# Altium footprint library SMT.PcbLib: 379 footprints (part 2 of 24)
Each footprint in its own frame and in the unit in brackets; x right, y up, seen from the top. Pads: shape width x height; smd on the part's side, far side on the other; paste and mask are expansions set on the pad; w line width, h text height; cw(c..) or ccw(c..) is an arc to the next point about the centre after c.
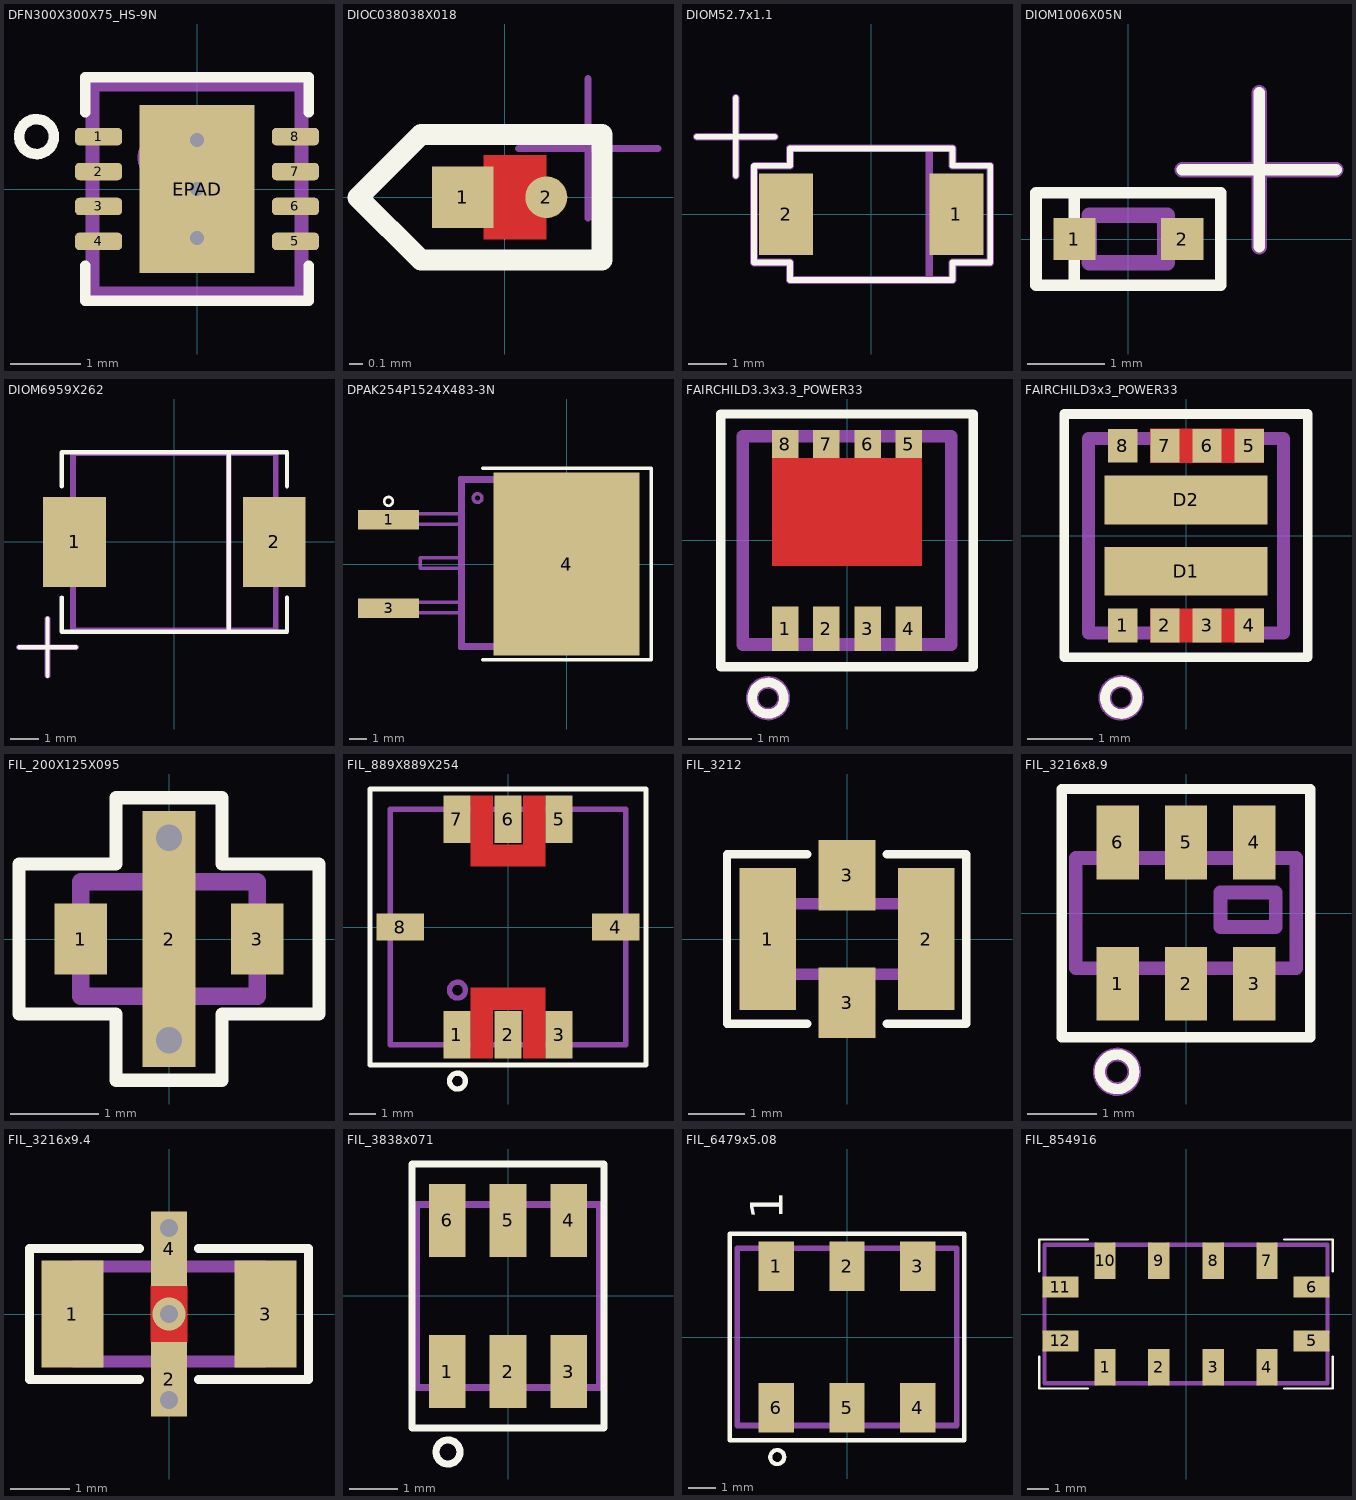
[diagram p1: the footprints below, top view; thin cyan lines are the x and y axes]

## DFN300X300X75_HS-9N [mm] "DFN, 8-Leads, Body 3,00x3,00mm, Pitch 0,5mm, Thermal Pad 1,65x2,40mm, IPC Medium Density"
height 0.75
pads (9):
  rrect50% 0.675x0.25 smd mask+0.05: 1(-1.41,0.75) 2(-1.41,0.25) 3(-1.41,-0.25) 4(-1.41,-0.75) 5(1.41,-0.75) 6(1.41,-0.25) 7(1.41,0.25) 8(1.41,0.75)
  rect 1.65x2.4 hole 0.2 mask+0.05: EPAD(0,0)
via 0,0.7 diameter 0.5 hole 0.2
via 0,-0.7 diameter 0.5 hole 0.2
Top Overlay:
  circle w0.15: c-2.3,0.75 r0.25
  lines w0.15: -1.6,-1.1 -1.6,-1.6 1.6,-1.6 1.6,-1.1 ; -1.6,1.1 -1.6,1.6 1.6,1.6 1.6,1.1
Top Paste:
  rectangle: -0.35,-0.65 0.35,0.65
Mechanical 1:
  circle w0.2: c-0.5,0.45 r0.25
  lines w0.2: -1.5,-1.5 1.5,-1.5 1.5,1.5 -1.5,1.5 -1.5,-1.5
3D body "User Library-My-DFN-8-3x3-0_5.STEP": height 0.81, standoff 0.01, extent -1.56,-1.55 1.56,1.55

## DIOC038038X018 [mm] "Chip diode 0.38mmx0.38mmx0.18mm"
height 0.18
pads (2):
  rect 0.44x0.44 smd paste-25.4 mask+0.05: 1(-0.3,0)
  round 0.3 smd paste-25.4 mask+0.05: 2(0.3,0)
Top Layer:
  pour cut-out: -0.15,-0.3 0.3,-0.3 0.3,0.3 -0.15,0.3
Top Overlay:
  lines w0.15: -1.05,0 -0.6,0.45 0.7,0.45 0.7,-0.45 -0.6,-0.45 -1.05,0
Mechanical 1:
  circle w0.05: c-0.3,0 r0.04
  lines w0.03: -0.3,0 ccw(c-0.15,0.35) 0,0 cw(c0.15,-0.35) 0.3,0
  lines w0.05: 0.1,0.35 1.1,0.35 ; 0.6,-0.15 0.6,0.85 ; -0.49,-0.19 -0.49,0.19 -0.11,0.19 -0.11,-0.19 -0.49,-0.19
Mechanical 20:
  text "Установка с помощью термокомпресионной сварки проволокой Кр Зл  999,9-0,03М ГОСТ 7222-75" at -2.143,1.487 h1.2
3D body "ma4l-134.STEP": height 0.26, standoff 0.01, extent -0.489,-0.191 0.316,0.189

## DIOM52.7x1.1 [mm]
height 1.1
pads (2):
  rect 1.4x2.1 smd paste-0.1: 1(2.2,0) 2(-2.2,0)
Top Overlay:
  lines w0.15: -4.5,2 -2.5,2 ; -3.5,1 -3.5,3 ; -2.1,-1.3 -2.1,-1.7 2.1,-1.7 2.1,-1.25 3.075,-1.25 3.075,1.25 2.1,1.25 2.1,1.7 -2.1,1.7 -2.1,1.25 -3.025,1.25 -3.025,-1.25 -2.1,-1.25
Mechanical 1:
  lines w0.2: -4.5,2 -2.5,2 ; -3.5,1 -3.5,3 ; -2.1,1.675 -2.1,1.25 ; 1.5,-1.7 1.5,1.7 ; -2.1,1.25 -3,1.25 -3.025,1.225 -3.025,-1.25 -2.1,-1.25 -2.1,-1.7 2.1,-1.7 2.1,-1.25 3.075,-1.25 3.075,1.25 2.1,1.25 2.1,1.7 -2.1,1.7 -2.1,1.25
3D body "User Library-SOD128.STEP": height 1.11, standoff 0, extent -2.5,-1.35 2.5,1.35

## DIOM1006X05N [mm] "Molded Diode, 2-Leads, Body 0,98x0,59mm, IPC Medium Density"
height 0.5
pads (2):
  rect 0.55x0.55 smd: 1(-0.7,0) 2(0.7,0)
Top Overlay:
  lines w0.15: -0.7,-0.6 -0.7,0.6 ; 0.7,0.9 2.7,0.9 ; 1.7,-0.1 1.7,1.9 ; -1.2,-0.6 1.2,-0.6 1.2,0.6 -1.2,0.6 -1.2,-0.6
Mechanical 1:
  rectangle: 0.373,-0.31 0.51,0.31
  lines w0.2: 0.7,0.9 2.7,0.9 ; 1.7,-0.1 1.7,1.9 ; -0.51,-0.31 0.51,-0.31 0.51,0.31 -0.51,0.31 -0.51,-0.31
3D body "DIOM1006X05N.step": height 0.5, standoff 0, extent -0.73,-0.31 0.73,0.31

## DIOM6959X262 [mm] "Molded Diode, 2-Leads, Body 6,85x5,90mm, IPC Medium Density"
height 2.62
pads (2):
  rect 2.2x3.15 smd: 1(-3.5,0) 2(3.5,0)
Top Overlay:
  lines w0.15: -5.45,-3.7 -3.45,-3.7 ; -4.45,-4.7 -4.45,-2.7 ; -3.95,-1.95 -3.95,-3.15 3.95,-3.15 3.95,-1.95 ; -3.95,1.95 -3.95,3.15 3.95,3.15 3.95,1.95 ; 1.905,-3.15 1.905,3.15
Mechanical 1:
  lines w0.2: -5.45,-3.7 -3.45,-3.7 ; -4.45,-4.7 -4.45,-2.7 ; 1.905,-3.11 1.905,3.11 ; -3.555,-3.11 -3.555,3.11 3.555,3.11 3.555,-3.11 -3.555,-3.11
3D body "DIOM7959X262N.STEP": height 2.62, standoff 0, extent -3.95,-2.95 3.95,2.95

## DPAK254P1524X483-3N [mm] "D2-PAK, 3-Pads, Body 7,93x8,50mm (max), IPC Medium Density"
height 4.83
pads (3):
  rect 3.504x1.1 smd: 1(-10.213,2.54) 3(-10.213,-2.54)
  rect 8.4x10.5 hole 0.3: 4(0,0)
Top Overlay:
  circle w0.15: c-10.213,3.598 r0.25
  lines w0.2: -4.801,-5.5 4.851,-5.5 4.851,5.5 -4.801,5.5
Top Paste:
  rectangle: -3.25,0.5 -0.5,3.25
  region: 3.25,3.25 0.5,3.25 0.5,0.5 3.25,0.5
  region: 3.25,-0.5 0.5,-0.5 0.5,-3.25 3.25,-3.25
  rectangle: -3.25,-3.25 -0.5,-0.5
Mechanical 1:
  circle w0.2: c-5.105,3.785 r0.25
  lines w0.2: -6.139,-2.787 -8.899,-2.787 ; -6.139,-2.187 -8.899,-2.187 ; -6.139,-0.247 -8.399,-0.247 -8.399,0.353 -6.139,0.353 ; -6.139,2.293 -8.899,2.293 ; -6.139,2.893 -8.899,2.893 ; -8.899,-2.787 -8.899,-2.187 ; -8.899,-2.787 -10.899,-2.787 -10.899,-2.187 -8.899,-2.187 ; -8.899,2.293 -8.899,2.893 ; -8.899,2.293 -10.899,2.293 -10.899,2.893 -8.899,2.893 ; -6.139,-4.847 2.761,-4.847 ; -6.139,-4.847 -6.139,4.953 ; -6.139,-4.847 -5.939,-4.647 ; -6.139,4.953 2.761,4.953 ; -6.139,4.953 -5.939,4.753 ; -5.939,-4.647 2.561,-4.647 ; -5.939,-4.647 -5.939,4.753 ; -5.939,4.753 2.561,4.753 ; 2.561,-4.647 2.561,4.753 ; 2.561,-4.647 2.761,-4.847 ; 2.561,4.753 2.761,4.953 ; 2.761,-4.847 2.861,-4.847 ; 2.761,4.953 2.861,4.953 ; 2.861,-4.847 3.601,-4.847 4.001,-4.447 4.001,4.553 3.601,4.953 2.861,4.953 ; 2.861,-4.847 2.861,4.953
3D body "D2Pack.stp": height 4.5, standoff 0, extent -11.521,-4.925 3.379,4.875

## FAIRCHILD3.3x3.3_POWER33 [mm] "Power33, 8-Leads, Body 3.3x3.3mm"
height 0.8
pads (8):
  rect 0.42x0.7 smd paste-0.01 mask+0.05: 1(-0.975,-1.4) 2(-0.325,-1.4) 3(0.325,-1.4) 4(0.975,-1.4)
  rect 0.42x0.45 smd paste-0.01 mask+0.05: 5(0.975,1.525) 6(0.325,1.525) 7(-0.325,1.525) 8(-0.975,1.525)
Top Layer:
  region: -1.185,-0.4 -1.185,1.3 1.185,1.3 1.185,-0.4
Top Overlay:
  circle w0.15: c-1.25,-2.5 r0.25
  lines w0.15: -2,-2 -2,2 2,2 2,-2 -2,-2
Top Paste:
  region: -1.17,0.5 -1.17,1.2 -0.1,1.2 -0.1,0.5
  region: -1.17,-0.37 -1.17,0.3 -0.1,0.3 -0.1,-0.37
  region: 0.1,0.5 0.1,1.2 1.17,1.2 1.17,0.5
  region: 0.1,-0.37 0.1,0.3 1.17,0.3 1.17,-0.37
Top Solder:
  region: -1.235,-0.45 -1.235,1.348 1.235,1.348 1.235,-0.45
Mechanical 1:
  circle w0.2: c-1.25,-2.5 r0.25
  lines w0.2: -1.65,-1.65 -1.65,1.65 1.65,1.65 1.65,-1.65 -1.65,-1.65
3D body "FCM8327L.STEP": height 0.75, standoff 0, extent -1.65,-1.65 1.65,1.65

## FAIRCHILD3x3_POWER33 [mm] "Power33, 10-Leads, Body 3x3mm"
height 0.8
pads (10):
  rect 0.45x0.52 smd mask+0.04: 1(-0.975,-1.385) 2(-0.325,-1.385) 3(0.325,-1.385) 4(0.975,-1.385) 5(0.975,1.385) 6(0.325,1.385) 7(-0.325,1.385) 8(-0.975,1.385)
  rect 2.52x0.75 smd paste-0.05 mask+0.04: D1(0,-0.55) D2(0,0.55)
Top Layer:
  region: -0.55,1.125 -0.55,1.645 1.2,1.645 1.2,1.125
  region: -0.55,-1.645 -0.55,-1.125 1.2,-1.125 1.2,-1.645
Top Overlay:
  circle w0.15: c-1,-2.5 r0.25
  lines w0.15: -1.875,-1.875 -1.875,1.875 1.875,1.875 1.875,-1.875 -1.875,-1.875
Top Solder:
  region: -0.59,-1.685 -0.59,-1.085 1.24,-1.085 1.24,-1.685
  region: -0.59,1.085 -0.59,1.685 1.24,1.685 1.24,1.085
Mechanical 1:
  circle w0.2: c-1,-2.5 r0.25
  lines w0.2: -1.5,-1.5 1.5,-1.5 1.5,1.5 -1.5,1.5 -1.5,-1.5
3D body "3D MODEL.stp": height 0.8, standoff 0, extent -1.5,-1.5 1.5,1.5

## FIL_200X125X095 [mm] "F0805, 3-Leads, Body 2,0x1,25mm"
height 0.95
pads (3):
  rect 0.6x0.8 smd paste+0: 1(-1,0) 3(1,0)
  rect 0.6x2.9 smd paste-10 mask-10: 2(0,0)
via 0,1.15 diameter 0.6 hole 0.3
via 0,-1.15 diameter 0.6 hole 0.3
Top Overlay:
  lines w0.15: -1.7,-0.85 -0.6,-0.85 -0.6,-1.6 0.6,-1.6 0.6,-0.85 1.7,-0.85 1.7,0.85 0.6,0.85 0.6,1.6 -0.6,1.6 -0.6,0.85 -1.7,0.85 -1.7,-0.85
Top Paste:
  rectangle: -0.3,0.3 0.3,0.95
  rectangle: -0.3,-0.95 0.3,-0.3
Top Solder:
  rectangle: -0.3,0.3 0.3,0.95
  rectangle: -0.3,-0.95 0.3,-0.3
Mechanical 1:
  lines w0.2: -1,-0.65 -1,0.65 1,0.65 1,-0.65 -1,-0.65
3D body "User Library-EMIFIL_0805.STEP": height 0.85, standoff 0, extent -1,-0.625 1,0.625

## FIL_889X889X254 [mm] "GP731, 8-Leads, Body 8,89x8,89mm"
height 2.54
pads (8):
  rect 1.02x1.78 smd: 1(-1.93,-4.064) 2(0,-4.064) 3(1.93,-4.064) 5(1.93,4.064) 6(0,4.064) 7(-1.93,4.064)
  rect 1.78x1.02 smd: 4(4.064,0) 8(-4.064,0)
Top Layer:
  pour cut-out: -1.397,-4.953 -1.397,-2.286 1.397,-2.286 1.397,-4.953 0.572,-4.953 0.572,-3.111 -0.572,-3.111 -0.572,-4.953
  pour cut-out: -1.397,4.953 -1.397,2.286 1.397,2.286 1.397,4.953 0.572,4.953 0.572,3.111 -0.572,3.111 -0.572,4.953
Top Overlay:
  circle w0.2: c-1.905,-5.81 r0.3
  lines w0.2: -5.207,-5.207 -5.207,5.207 5.207,5.207 5.207,-5.207 -5.207,-5.207
Mechanical 1:
  circle w0.2: c-1.905,-2.381 r0.3
  lines w0.2: -4.445,-4.445 4.445,-4.445 4.445,4.445 -4.445,4.445 -4.445,-4.445
3D body "Корпус GP731 (Mini-Circuits).stp": height 2.54, standoff 0, extent -4.445,-4.445 4.445,4.445

## FIL_3212 [mm] "SMD; Body: 3,2x1,25x3,2; Фильтр помехоподавляющий"
height 3.2
pads (4):
  rect 1x2.5 smd mask+0.05: 1(-1.4,0) 2(1.4,0)
  rect 1x1.25 smd paste+0 mask+0.05: 3(0,-1.125) 3(0,1.125)
Top Overlay:
  lines w0.15: -0.7,-1.5 -2.12,-1.5 -2.12,1.5 -0.7,1.5 ; 0.7,-1.5 2.11,-1.5 2.11,1.5 0.7,1.5
Mechanical 1:
  lines w0.2: -1.6,-0.625 1.6,-0.625 1.6,0.625 -1.6,0.625 -1.6,-0.625
3D body "Б36 _ ФИЛЬТР.stp": height 3.2, standoff 0, extent -1.6,-0.626 1.6,0.626

## FIL_3216x8.9 [mm] "FILTER 4-Leads, Body 3,20x1,60mm"
height 0.89
pads (6):
  rect 0.61x1.07 smd: 1(-0.99,-1.025) 2(0,-1.025) 3(0.99,-1.025) 4(0.99,1.025) 5(0,1.025) 6(-0.99,1.025)
Top Overlay:
  circle w0.15: c-1,-2.3 r0.25
  lines w0.15: -1.8,-1.8 -1.8,1.8 1.8,1.8 1.8,-1.8 -1.8,-1.8
Mechanical 1:
  circle w0.2: c-1,-2.3 r0.25
  lines w0.2: -1.6,-0.8 -1.6,0.8 1.6,0.8 1.6,-0.8 -1.6,-0.8 ; 0.5,-0.2 0.5,0.3 1.3,0.3 1.3,-0.2 0.5,-0.2
3D body "QCN-45+.stp": height 0.93, standoff 0.02, extent -1.6,-0.81 1.6,0.81

## FIL_3216x9.4 [mm] "FILTER 4-Leads, Body 3,20x1,60mm"
height 0.94
pads (4):
  rect 1.04x1.8 smd: 1(-1.625,0) 3(1.625,0)
  rect 0.61x1.25 smd paste-5 mask-5: 2(0,-1.1) 4(0,1.1)
via 0,1.45 diameter 0.55 hole 0.3
via 0,-1.45 diameter 0.55 hole 0.3
via 0,0.001 diameter 0.55 hole 0.3
Top Layer:
  region: -0.305,0.476 -0.305,-0.475 0.305,-0.475 0.305,0.476
Top Overlay:
  lines w0.15: -2.35,1.1 -2.35,-1.105 -0.5,-1.105 ; -2.35,1.105 -0.5,1.105 ; 0.5,-1.105 2.35,-1.105 2.35,1.105 0.5,1.105
Top Paste:
  rectangle: -0.275,0.475 0.275,1.15
  rectangle: -0.275,-1.149 0.275,-0.474
Top Solder:
  rectangle: -0.305,0.425 0.305,1.2
  rectangle: -0.305,-1.2 0.305,-0.425
Mechanical 1:
  lines w0.2: -1.6,-0.8 -1.6,0.8 1.6,0.8 1.6,-0.8 -1.6,-0.8
3D body "1206-3.STEP": height 1.27, standoff 0.02, extent -1.6,-0.821 1.6,0.829

## FIL_3838x071 [mil] "FR933 3.81x3.81x0.71"
height 27.95
pads (6):
  rect 30x60 smd: 1(-50,-62) 2(0,-62) 3(50,-62) 4(50,62) 5(0,62) 6(-50,62)
Top Overlay:
  circle w5.91: c-49.21,-127.95 r9.84
  lines w5.91: -78.74,-108.27 -78.74,108.27 78.74,108.27 78.74,-108.27 -78.74,-108.27
Mechanical 1:
  circle w7.87: c-49.21,-49.21 r9.84
  lines w5.91: -74.99,-74.99 -74.99,75 75,75 75,-74.99 -74.99,-74.99
3D body "HFTC-9R5.stp": height 28.39, standoff 0.44, extent -74.99,-74.99 75,75

## FIL_6479x5.08 [mm] "FILTER 6-Leads, Body 6,35x7,87mm"
height 5.08
pads (6):
  rect 1.27x1.78 smd: 1(-2.54,2.54) 2(0,2.54) 3(2.54,2.54) 4(2.54,-2.54) 5(0,-2.54) 6(-2.54,-2.54)
Top Overlay:
  circle w0.15: c-2.5,-4.3 r0.25
  lines w0.15: -4.2,-3.7 4.2,-3.7 4.2,3.7 -4.2,3.7 -4.2,-3.7
  text "1" at -1.9,4.2 h2
Mechanical 1:
  circle w0.2: c-2.5,-2.5 r0.25
  lines w0.2: -3.93,-3.17 3.94,-3.17 3.94,3.18 -3.93,3.18 -3.93,-3.17
3D body "RMS-25MH+.stp": height 5.11, standoff 0.02, extent -3.935,-3.185 3.935,3.185

## FIL_854916 [mm] "Ceramic 13.30 x 6.50 x 1.75 mm"
height 1.96
pads (12):
  rect 1x1.7 smd paste-0.05 mask+0.05: 1(-3.805,-2.5) 2(-1.275,-2.5) 3(1.275,-2.5) 4(3.805,-2.5) 7(3.805,2.5) 8(1.275,2.5) 9(-1.275,2.5) 10(-3.805,2.5)
  rect 1.7x1 smd paste-0.05 mask+0.05: 5(5.905,-1.265) 6(5.905,1.265) 11(-5.905,1.265) 12(-5.905,-1.265)
Top Overlay:
  lines w0.1: -6.9,-2 -6.9,-3.5 -4.6,-3.5 ; -6.9,2 -6.9,3.5 -4.6,3.5 ; 4.6,-3.5 6.9,-3.5 6.9,-2 ; 4.6,3.5 6.9,3.5 6.9,2
Mechanical 1:
  circle w0.2: c-3.775,-2.05 r0.25
  lines w0.2: -6.65,-3.25 -4.21,-3.25 cw(c-3.81,-3.25) -3.41,-3.25 -1.67,-3.25 cw(c-1.27,-3.25) -0.87,-3.25 0.87,-3.25 cw(c1.27,-3.25) 1.67,-3.25 3.41,-3.25 cw(c3.81,-3.25) 4.21,-3.25 6.65,-3.25 6.65,-1.67 cw(c6.65,-1.27) 6.65,-0.87 6.65,0.87 cw(c6.65,1.27) 6.65,1.67 6.65,3.25 4.21,3.25 cw(c3.81,3.25) 3.41,3.25 1.67,3.25 cw(c1.27,3.25) 0.87,3.25 -0.87,3.25 cw(c-1.27,3.25) -1.67,3.25 -3.41,3.25 cw(c-3.81,3.25) -4.21,3.25 -6.65,3.25 -6.65,1.67 cw(c-6.65,1.27) -6.65,0.87 -6.65,-0.87 cw(c-6.65,-1.27) -6.65,-1.67 -6.65,-3.25
3D body "854916.stp": height 2.02, standoff 0.01, extent -6.65,-3.25 6.65,3.25